# Altium footprint library Library.PcbLib: 308 footprints (part 16 of 21)
Each footprint in its own frame and in the unit in brackets; x right, y up, seen from the top. Pads: shape width x height; smd on the part's side, far side on the other; paste and mask are expansions set on the pad; w line width, h text height; cw(c..) or ccw(c..) is an arc to the next point about the centre after c.
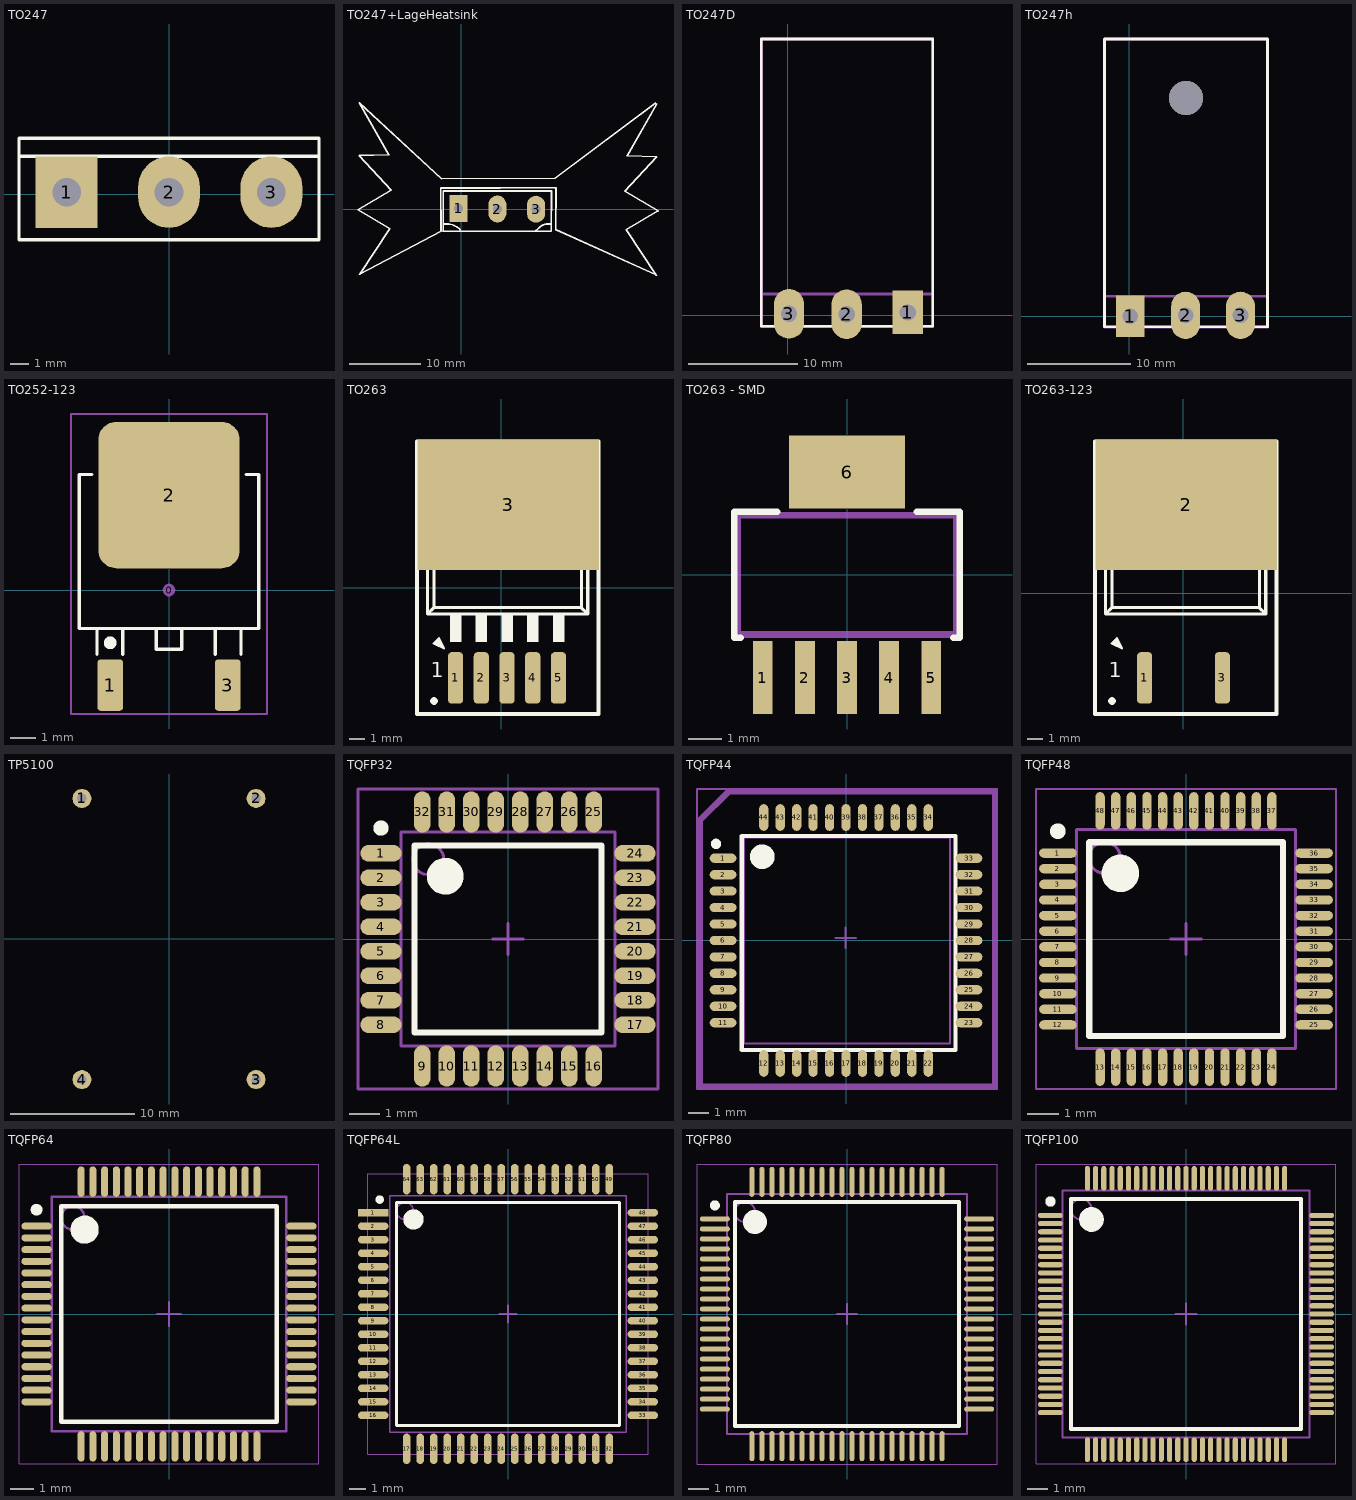
[diagram p15: the footprints below, top view; thin cyan lines are the x and y axes]

## TO247 [mil] "TO247"
height 200
pads (3):
  rect 130x150 hole 60: 1(-215,5)
  oval 130x150 hole 60: 2(0,5) 3(215,5)
Top Overlay:
  lines w7: -315,80 314,80 ; -315,-95 -315,118 315,118 315,-95 -315,-95
3D body "User Library-TO-247 CASE 340L-02 Vertical.STEP": height 1202.76, standoff -427.17, extent -314.96,-81.61 314.96,115.24

## TO247+LageHeatsink [mil]
pads (3):
  rect 100x150 hole 50: 1(-15,5)
  oval 100x150 hole 50: 2(200,1) 3(415,0)
Top Overlay:
  lines w10: -102,-121 -101,-120 -101,102 501,102 500,-122 -101,-122 -100,-121 ; -100,-82 -80.43,-82 cw(c-80.43,-184.43) -8,-112 ; 208,119 526,119 524,-113 1082,-364 ; 214,118 -115,118 -113,-122 -566,-361 -398,-108 -575,-3 -391,106 -568,298 -403,303 -568,592 -111,170 520,172 1078,590 ; 415,-119 ccw(c415,-116.59) 416.71,-118.29 434,-101 cw(c479.87,-146.87) 479.87,-82 499,-82 ; 1084,-367 916,-114 1093,-9 909,100 1086,292 921,297 1086,586
3D body "User Library-OHMITE_FA-T220-64E.step": height 2600, standoff -49.61, extent -613.9,-364.71 1023.89,624.71
3D body "User Library-TO-247 CASE 340L-02 Vertical.STEP": height 1187.01, standoff -442.91, extent -114.96,-85 514.96,111.85

## TO247D [mil]
pads (3):
  rect 110x157.48 hole 59.06: 1(435,10)
  oval 110x180 hole 59.06: 2(213.66,4) 3(5,5)
Top Overlay:
  lines w10: -95,-40 -95,1000 525,1000 525,-40 -95,-40
Mechanical 1:
  lines w10: -93.43,76.83 520.75,76.83 ; -93.43,-41.28 525,-41.28 525,1000 -93.43,1000 -93.43,-41.28
3D body "User Library-TO-247H.step": height 216.54, standoff -251.97, extent -85.11,-4.99 525.12,995.01

## TO247h [mil]
pads (3):
  rect 110x157.48 hole 59.06: 1(3,1)
  oval 110x180 hole 59.06: 2(213.66,4) 3(422.32,4)
via 215,830 diameter 129.92 hole 129.92
Top Overlay:
  lines w10: -95,-40 -95,1055 525,1055 525,-40 -95,-40
Mechanical 1:
  lines w10: -93.43,76.83 520.75,76.83 ; -93.43,-41.28 525,-41.28 525,1055 -93.43,1055 -93.43,-41.28
3D body "User Library-TO-247_bent_leads.step": height 212.6, standoff -259.84, extent -97.99,-15 527.99,1047.28

## TO252-123 [mm]
pads (4):
  round 0.5 on Mech15: 0(0,0)
  rrect25% 1x2 smd: 1(-2.285,-3.7) 3(2.285,-3.7)
  rrect25% 5.5x5.7 smd: 2(0,3.7)
Top Overlay:
  circle w0.25: c-2.289,-2.053 r0.125
  lines w0.127: -3,4.5 -3.5,4.5 -3.5,-1.5 3.5,-1.5 3.5,4.5 3,4.5 ; -2.8,-2.5 -2.8,-1.5 -1.8,-1.5 -1.8,-2.5 ; 1.8,-2.5 1.8,-1.5 2.8,-1.5 2.8,-2.5 ; -0.5,-2.3 -0.5,-1.5 0.5,-1.5 0.5,-2.3 -0.5,-2.3
Mechanical 15:
  lines w0.076: -3.81,-4.826 -3.81,6.858 3.81,6.858 3.81,-4.826 -3.81,-4.826
3D body "DPAK.stp": height 2.31, standoff 0, extent -3.3,-3.951 3.3,5.762

## TO263 [mm]
pads (6):
  rrect50% 1x3.4 smd: 1(-3.019,-5.969) 2(-1.319,-5.969) 4(2.081,-5.969) 5(3.781,-5.969)
  rrect50% 1x3.4 smd mask+0: 3(0.381,-5.969)
  rect 12x8.634 smd: 3(0.457,5.461)
Top Overlay:
  circle w0.25: c-4.443,-7.493 r0.125
  rectangle: -3.398,-3.607 -2.64,-1.728
  rectangle: -1.698,-3.607 -0.94,-1.728
  rectangle: 0.002,-3.607 0.76,-1.728
  rectangle: 1.702,-3.607 2.46,-1.728
  rectangle: 3.402,-3.607 4.16,-1.728
  lines w0.127: -4.293,-3.511 -4.104,-3.319 -3.774,-4.03 ; -4.293,-3.511 -4.485,-3.7 -3.774,-4.03 ; -4.293,-3.511 -3.774,-4.03
  lines w0.178: -4.307,-3.649 -4.129,-3.827 ; -4.155,-3.497 -3.977,-3.675
  lines w0.2: -4.873,-1.753 5.71,-1.753 ; -4.873,-1.753 -4.873,6.926 ; -4.873,-1.753 -4.45,-1.329 ; -4.873,6.926 5.71,6.926 ; -4.873,6.926 -4.873,7.747 -3.392,8.619 4.228,8.619 5.71,7.747 5.71,6.926 ; -4.873,6.926 -4.45,6.502 ; -4.45,-1.329 -4.45,6.502 ; -4.45,-1.329 5.287,-1.329 ; -4.45,6.502 5.287,6.502 ; 5.287,-1.329 5.287,6.502 ; 5.287,-1.329 5.71,-1.753 ; 5.287,6.502 5.71,6.926 ; 5.71,-1.753 5.71,6.926
  lines w0.254: -5.568,-8.35 -5.568,9.65 6.432,9.65 6.432,-8.35 -5.568,-8.35
  text "1" at -4.645,-5.918 h1
Top Solder:
  rectangle: -5.136,1.397 5.99,8.56
  lines w0.254: -3.482,8.935 -4.963,8.512 ; 4.319,8.935 5.8,8.512 ; 5.969,8.382 6.096,8.255 6.096,1.27 5.461,1.27 -5.197,1.27 -5.202,1.275 -5.202,6.926 -5.202,8.196 ; 6.039,6.926 6.039,8.196 ; -5.202,8.196 cw(c-4.873,8.196) -4.964,8.512 ; -5.202,8.196 cw(c-4.873,8.196) -4.964,8.512 ; -3.392,8.948 ccw(c-3.392,8.619) -3.482,8.935 cw(c-3.392,8.619) -3.392,8.948 ; -3.392,8.948 4.228,8.948 ; 4.228,8.948 cw(c4.228,8.619) 4.319,8.935 ccw(c4.228,8.619) 4.228,8.948 ; 5.801,8.512 cw(c5.71,8.196) 6.039,8.196 ; 5.801,8.512 cw(c5.71,8.196) 6.039,8.196
  lines w0.508: -4.196,8.577 5.05,8.577
3D body "SW3dPS-TO-263 5Ld.STEP": height 4.57, standoff -0.01, extent -4.729,-6.839 5.431,7.801

## TO263 - SMD [mm]
pads (6):
  rect 0.6x2.2 smd: 1(-2.54,-3.1) 2(-1.27,-3.1) 3(0,-3.1) 4(1.27,-3.1) 5(2.54,-3.1)
  rect 3.5x2.2 smd: 6(0,3.1)
Top Overlay:
  lines w0.2: -3.2,-1.9 -3.4,-1.9 -3.4,1.9 -2.1,1.9 ; 2.1,1.9 3.4,1.9 3.4,-1.9 3.2,-1.9
Mechanical 16:
  lines w0.2: -3.3,-1.8 -3.3,1.8 3.3,1.8 3.3,-1.8 -3.3,-1.8
3D body "TPS73701DCQ.step": height 1.8, standoff 0, extent -3.275,-3.63 3.275,3.63

## TO263-123 [mm]
pads (3):
  rrect50% 1x3.4 smd: 1(-2.54,-5.588) 3(2.591,-5.588)
  rect 12x8.634 smd: 2(0.203,5.842)
Top Overlay:
  circle w0.25: c-4.697,-7.112 r0.125
  lines w0.127: -4.547,-3.13 -4.358,-2.938 -4.028,-3.649 ; -4.547,-3.13 -4.739,-3.319 -4.028,-3.649 ; -4.547,-3.13 -4.028,-3.649
  lines w0.178: -4.561,-3.268 -4.383,-3.446 ; -4.409,-3.116 -4.231,-3.294
  lines w0.2: -5.127,-1.372 5.456,-1.372 ; -5.127,-1.372 -5.127,7.307 ; -5.127,-1.372 -4.704,-0.948 ; -5.127,7.307 5.456,7.307 ; -5.127,7.307 -5.127,8.128 -3.646,9 3.974,9 5.456,8.128 5.456,7.307 ; -5.127,7.307 -4.704,6.883 ; -4.704,-0.948 -4.704,6.883 ; -4.704,-0.948 5.033,-0.948 ; -4.704,6.883 5.033,6.883 ; 5.033,-0.948 5.033,6.883 ; 5.033,-0.948 5.456,-1.372 ; 5.033,6.883 5.456,7.307 ; 5.456,-1.372 5.456,7.307
  lines w0.254: -5.822,-7.969 -5.822,10.031 6.178,10.031 6.178,-7.969 -5.822,-7.969
  text "1" at -4.899,-5.537 h1
Top Solder:
  rectangle: -5.39,1.778 5.736,8.941
  lines w0.254: -3.736,9.316 -5.217,8.893 ; 4.065,9.316 5.546,8.893 ; 5.715,8.763 5.842,8.636 5.842,1.651 5.207,1.651 -5.451,1.651 -5.456,1.656 -5.456,7.307 -5.456,8.577 ; 5.785,7.307 5.785,8.577 ; -5.456,8.577 cw(c-5.127,8.577) -5.218,8.893 ; -5.456,8.577 cw(c-5.127,8.577) -5.218,8.893 ; -3.646,9.329 ccw(c-3.646,9) -3.736,9.316 cw(c-3.646,9) -3.646,9.329 ; -3.646,9.329 3.974,9.329 ; 3.974,9.329 cw(c3.974,9) 4.065,9.316 ccw(c3.974,9) 3.974,9.329 ; 5.547,8.893 cw(c5.456,8.577) 5.785,8.577 ; 5.547,8.893 cw(c5.456,8.577) 5.785,8.577
  lines w0.508: -4.45,8.958 4.796,8.958
3D body "User Library-TO263-3S.STEP": height 4.81, standoff 0.01, extent -4.967,-6.477 5.033,9.193

## TP5100 [mil] "2A Lion Charger"
pads (4):
  round 60 hole 30: 1(-275.59,444.88) 2(275.59,444.88) 3(275.59,-444.88) 4(-275.59,-444.88)
3D body "tp5100 v2 (step).step": height 194.49, standoff 15.75, extent -334.65,-492.13 334.65,492.13

## TQFP32 [mm] "Thin QFP, 32-Leads, Body 9x9mm, Pitch 0.8mm, IPC Low Density"
height 1.6
pads (32):
  oval 1.35x0.55 smd: 1(-4.15,2.8) 2(-4.15,2) 3(-4.15,1.2) 4(-4.15,0.4) 5(-4.15,-0.4) 6(-4.15,-1.2) 7(-4.15,-2) 8(-4.15,-2.8) 17(4.15,-2.8) 18(4.15,-2) 19(4.15,-1.2) 20(4.15,-0.4) 21(4.15,0.4) 22(4.15,1.2) 23(4.15,2) 24(4.15,2.8)
  oval 0.55x1.35 smd: 9(-2.8,-4.15) 10(-2,-4.15) 11(-1.2,-4.15) 12(-0.4,-4.15) 13(0.4,-4.15) 14(1.2,-4.15) 15(2,-4.15) 16(2.8,-4.15) 25(2.8,4.15) 26(2,4.15) 27(1.2,4.15) 28(0.4,4.15) 29(-0.4,4.15) 30(-1.2,4.15) 31(-2,4.15) 32(-2.8,4.15)
Top Overlay:
  circle w0.25: c-4.15,3.625 r0.125
  circle w0.6: c-2.05,2.05 r0.3
  lines w0.2: -3.05,-3.05 -3.05,3.05 3.05,3.05 3.05,-3.05 -3.05,-3.05
Mechanical 13:
  circle w0.1: c-2.6,2.6 r0.5
  lines w0.1: -3.5,-3.5 -3.5,3.5 3.5,3.5 3.5,-3.5 -3.5,-3.5
Mechanical 15:
  lines w0.1: -0.5,0 0.5,0 ; 0,-0.5 0,0.5 ; -4.9,-4.9 -4.9,4.9 4.9,4.9 4.9,-4.9 -4.9,-4.9
3D body "User Library-TQFP-32.STEP": height 1.4, standoff -0.06, extent -4.5,-4.5 4.5,4.5

## TQFP44 [mm] "TQFP, 44-Leads, Body 10X10mm, Pitch 0.80mm, IPC High Density"
height 1.2
pads (44):
  oval 1.3x0.45 smd: 1(-5.981,4) 2(-5.981,3.2) 3(-5.981,2.4) 4(-5.981,1.6) 5(-5.981,0.8) 6(-5.981,0) 7(-5.981,-0.8) 8(-5.981,-1.6) 9(-5.981,-2.4) 10(-5.981,-3.2) 11(-5.981,-4) 23(5.981,-4) 24(5.981,-3.2) 25(5.981,-2.4) 26(5.981,-1.6) 27(5.981,-0.8) 28(5.981,0) 29(5.981,0.8) 30(5.981,1.6) 31(5.981,2.4) 32(5.981,3.2) 33(5.981,4)
  oval 0.45x1.3 smd: 12(-4,-5.981) 13(-3.2,-5.981) 14(-2.4,-5.981) 15(-1.6,-5.981) 16(-0.8,-5.981) 17(0,-5.981) 18(0.8,-5.981) 19(1.6,-5.981) 20(2.4,-5.981) 21(3.2,-5.981) 22(4,-5.981) 34(4,5.981) 35(3.2,5.981) 36(2.4,5.981) 37(1.6,5.981) 38(0.8,5.981) 39(0,5.981) 40(-0.8,5.981) 41(-1.6,5.981) 42(-2.4,5.981) 43(-3.2,5.981) 44(-4,5.981)
Top Overlay:
  circle w0.25: c-6.323,4.698 r0.125
  circle w0.6: c-4.073,4.073 r0.3
  lines w0.2: -5.073,-5.327 -5.073,5.073 5.327,5.073 5.327,-5.327 -5.073,-5.327
Mechanical 13:
  circle w0.1: c-4.053,4.1 r0.5
  lines w0.1: -4.953,-5 -4.953,5 5.047,5 5.047,-5 -4.953,-5
Mechanical 15:
  lines w0.1: -0.516,0.127 0.484,0.127 ; -0.016,-0.373 -0.016,0.627 ; -7.239,-7.223 -7.239,7.366 7.334,7.366 7.334,-7.223 -7.239,-7.223
  lines w0.3: -7.112,-7.112 7.239,-7.112 7.239,7.239 -5.715,7.239 -7.112,5.842 -7.112,-7.112
  text ".Designator" at -4.4,0 h1
Mechanical 16:
  lines w0.3: -7.112,-7.112 7.239,-7.112 7.239,7.239 -5.715,7.239 -7.112,5.842 -7.112,-7.112
  text ".Comment" at -4.4,-2.4 h1
3D body "User Library-TQFP44.step": height 1.05, standoff -0.02, extent -5.994,-5.957 6.006,6.043

## TQFP48 [mm] "TQFP, 48-Leads, Body 7.00x7.00mm, Pitch 0.50mm, IPC High Density"
height 1.6
pads (48):
  oval 1.2x0.3 smd: 1(-4.1,2.75) 2(-4.1,2.25) 3(-4.1,1.75) 4(-4.1,1.25) 5(-4.1,0.75) 6(-4.1,0.25) 7(-4.1,-0.25) 8(-4.1,-0.75) 9(-4.1,-1.25) 10(-4.1,-1.75) 11(-4.1,-2.25) 12(-4.1,-2.75) 25(4.1,-2.75) 26(4.1,-2.25) 27(4.1,-1.75) 28(4.1,-1.25) 29(4.1,-0.75) 30(4.1,-0.25) 31(4.1,0.25) 32(4.1,0.75) 33(4.1,1.25) 34(4.1,1.75) 35(4.1,2.25) 36(4.1,2.75)
  oval 0.3x1.2 smd: 13(-2.75,-4.1) 14(-2.25,-4.1) 15(-1.75,-4.1) 16(-1.25,-4.1) 17(-0.75,-4.1) 18(-0.25,-4.1) 19(0.25,-4.1) 20(0.75,-4.1) 21(1.25,-4.1) 22(1.75,-4.1) 23(2.25,-4.1) 24(2.75,-4.1) 37(2.75,4.1) 38(2.25,4.1) 39(1.75,4.1) 40(1.25,4.1) 41(0.75,4.1) 42(0.25,4.1) 43(-0.25,4.1) 44(-0.75,4.1) 45(-1.25,4.1) 46(-1.75,4.1) 47(-2.25,4.1) 48(-2.75,4.1)
Top Overlay:
  circle w0.25: c-4.1,3.45 r0.125
  circle w0.6: c-2.1,2.1 r0.3
  lines w0.2: -3.1,-3.1 -3.1,3.1 3.1,3.1 3.1,-3.1 -3.1,-3.1
Mechanical 13:
  circle w0.1: c-2.6,2.6 r0.5
  lines w0.1: -3.5,-3.5 -3.5,3.5 3.5,3.5 3.5,-3.5 -3.5,-3.5
Mechanical 15:
  lines w0.05: -4.8,-4.8 -4.8,4.8 4.8,4.8 4.8,-4.8 -4.8,-4.8
  lines w0.1: -0.5,0 0.5,0 ; 0,-0.5 0,0.5
3D body "User Library-TQFP-48.STEP": height 1.45, standoff -0.01, extent -4.5,-4.5 4.5,4.5

## TQFP64 [mm] "TQFP, 64-Leads, Body 10.00x10.00mm, Pitch 0.50mm, IPC High Density"
height 1.3
pads (64):
  oval 1.3x0.3 smd: 1(-5.65,3.75) 2(-5.65,3.25) 3(-5.65,2.75) 4(-5.65,2.25) 5(-5.65,1.75) 6(-5.65,1.25) 7(-5.65,0.75) 8(-5.65,0.25) 9(-5.65,-0.25) 10(-5.65,-0.75) 11(-5.65,-1.25) 12(-5.65,-1.75) 13(-5.65,-2.25) 14(-5.65,-2.75) 15(-5.65,-3.25) 16(-5.65,-3.75) 33(5.65,-3.75) 34(5.65,-3.25) 35(5.65,-2.75) 36(5.65,-2.25) 37(5.65,-1.75) 38(5.65,-1.25) 39(5.65,-0.75) 40(5.65,-0.25) 41(5.65,0.25) 42(5.65,0.75) 43(5.65,1.25) 44(5.65,1.75) 45(5.65,2.25) 46(5.65,2.75) 47(5.65,3.25) 48(5.65,3.75)
  oval 0.3x1.3 smd: 17(-3.75,-5.65) 18(-3.25,-5.65) 19(-2.75,-5.65) 20(-2.25,-5.65) 21(-1.75,-5.65) 22(-1.25,-5.65) 23(-0.75,-5.65) 24(-0.25,-5.65) 25(0.25,-5.65) 26(0.75,-5.65) 27(1.25,-5.65) 28(1.75,-5.65) 29(2.25,-5.65) 30(2.75,-5.65) 31(3.25,-5.65) 32(3.75,-5.65) 49(3.75,5.65) 50(3.25,5.65) 51(2.75,5.65) 52(2.25,5.65) 53(1.75,5.65) 54(1.25,5.65) 55(0.75,5.65) 56(0.25,5.65) 57(-0.25,5.65) 58(-0.75,5.65) 59(-1.25,5.65) 60(-1.75,5.65) 61(-2.25,5.65) 62(-2.75,5.65) 63(-3.25,5.65) 64(-3.75,5.65)
Top Overlay:
  circle w0.6: c-3.6,3.6 r0.3
  circle w0.25: c-5.65,4.45 r0.125
  lines w0.2: -4.6,-4.6 4.6,-4.6 4.6,4.6 -4.6,4.6 -4.6,-4.6
Mechanical 13:
  circle w0.1: c-4.1,4.1 r0.5
  lines w0.1: -5,-5 5,-5 5,5 -5,5 -5,-5
Mechanical 15:
  lines w0.05: -6.4,-6.4 6.4,-6.4 6.4,6.4 -6.4,6.4 -6.4,-6.4
  lines w0.1: -0.5,0 0.5,0 ; 0,-0.5 0,0.5
3D body "User Library-S-PQFP-G64.step": height 1, standoff 0, extent -5.787,-5.79 5.787,5.791

## TQFP64L [mm] "TQFP, 64-Leads, Body 14.00x14.00mm, Pitch 0.80mm, IPC High Density"
height 1.4
pads (64):
  rect 1.8x0.45 smd: 1(-7.981,6)
  oval 1.8x0.45 smd: 2(-7.981,5.2) 3(-7.981,4.4) 4(-7.981,3.6) 5(-7.981,2.8) 6(-7.981,2) 7(-7.981,1.2) 8(-7.981,0.4) 9(-7.981,-0.4) 10(-7.981,-1.2) 11(-7.981,-2) 12(-7.981,-2.8) 13(-7.981,-3.6) 14(-7.981,-4.4) 15(-7.981,-5.2) 16(-7.981,-6) 33(7.981,-6) 34(7.981,-5.2) 35(7.981,-4.4) 36(7.981,-3.6) 37(7.981,-2.8) 38(7.981,-2) 39(7.981,-1.2) 40(7.981,-0.4) 41(7.981,0.4) 42(7.981,1.2) 43(7.981,2) 44(7.981,2.8) 45(7.981,3.6) 46(7.981,4.4) 47(7.981,5.2) 48(7.981,6)
  oval 0.45x1.8 smd: 17(-6,-7.981) 18(-5.2,-7.981) 19(-4.4,-7.981) 20(-3.6,-7.981) 21(-2.8,-7.981) 22(-2,-7.981) 23(-1.2,-7.981) 24(-0.4,-7.981) 25(0.4,-7.981) 26(1.2,-7.981) 27(2,-7.981) 28(2.8,-7.981) 29(3.6,-7.981) 30(4.4,-7.981) 31(5.2,-7.981) 32(6,-7.981) 49(6,7.981) 50(5.2,7.981) 51(4.4,7.981) 52(3.6,7.981) 53(2.8,7.981) 54(2,7.981) 55(1.2,7.981) 56(0.4,7.981) 57(-0.4,7.981) 58(-1.2,7.981) 59(-2,7.981) 60(-2.8,7.981) 61(-3.6,7.981) 62(-4.4,7.981) 63(-5.2,7.981) 64(-6,7.981)
Top Overlay:
  circle w0.6: c-5.6,5.6 r0.3
  circle w0.25: c-7.6,6.775 r0.125
  lines w0.2: -6.604,-6.604 6.596,-6.604 ; -6.6,-6.6 -6.6,6.6 6.6,6.6 6.6,-6.6
Mechanical 13:
  circle w0.1: c-6.1,6.1 r0.5
  lines w0.1: -7,-7 7,-7 7,7 -7,7 -7,-7
Mechanical 15:
  lines w0.05: -8.3,-8.3 8.3,-8.3 8.3,8.3 -8.3,8.3 -8.3,-8.3
  lines w0.1: -0.5,0 0.5,0 ; 0,-0.5 0,0.5
3D body "User Library-atmega64 (tqfp64).step": height 1.1, standoff -0.01, extent -7.968,-7.968 8.032,8.032

## TQFP80 [mm] "TQFP, 80-Leads, Body 12.00x12.00mm, Pitch 0.50mm, IPC High Density"
height 1
pads (80):
  oval 1.5x0.25 smd: 1(-6.6,4.75) 2(-6.6,4.25) 3(-6.6,3.75) 4(-6.6,3.25) 5(-6.6,2.75) 6(-6.6,2.25) 7(-6.6,1.75) 8(-6.6,1.25) 9(-6.6,0.75) 10(-6.6,0.25) 11(-6.6,-0.25) 12(-6.6,-0.75) 13(-6.6,-1.25) 14(-6.6,-1.75) 15(-6.6,-2.25) 16(-6.6,-2.75) 17(-6.6,-3.25) 18(-6.6,-3.75) 19(-6.6,-4.25) 20(-6.6,-4.75) 41(6.6,-4.75) 42(6.6,-4.25) 43(6.6,-3.75) 44(6.6,-3.25) 45(6.6,-2.75) 46(6.6,-2.25) 47(6.6,-1.75) 48(6.6,-1.25) 49(6.6,-0.75) 50(6.6,-0.25) 51(6.6,0.25) 52(6.6,0.75) 53(6.6,1.25) 54(6.6,1.75) 55(6.6,2.25) 56(6.6,2.75) 57(6.6,3.25) 58(6.6,3.75) 59(6.6,4.25) 60(6.6,4.75)
  oval 0.25x1.5 smd: 21(-4.75,-6.6) 22(-4.25,-6.6) 23(-3.75,-6.6) 24(-3.25,-6.6) 25(-2.75,-6.6) 26(-2.25,-6.6) 27(-1.75,-6.6) 28(-1.25,-6.6) 29(-0.75,-6.6) 30(-0.25,-6.6) 31(0.25,-6.6) 32(0.75,-6.6) 33(1.25,-6.6) 34(1.75,-6.6) 35(2.25,-6.6) 36(2.75,-6.6) 37(3.25,-6.6) 38(3.75,-6.6) 39(4.25,-6.6) 40(4.75,-6.6) 61(4.75,6.6) 62(4.25,6.6) 63(3.75,6.6) 64(3.25,6.6) 65(2.75,6.6) 66(2.25,6.6) 67(1.75,6.6) 68(1.25,6.6) 69(0.75,6.6) 70(0.25,6.6) 71(-0.25,6.6) 72(-0.75,6.6) 73(-1.25,6.6) 74(-1.75,6.6) 75(-2.25,6.6) 76(-2.75,6.6) 77(-3.25,6.6) 78(-3.75,6.6) 79(-4.25,6.6) 80(-4.75,6.6)
Top Overlay:
  circle w0.25: c-6.6,5.425 r0.125
  circle w0.6: c-4.6,4.6 r0.3
  lines w0.2: -5.6,-5.6 -5.6,5.6 5.6,5.6 5.6,-5.6 -5.6,-5.6
Mechanical 13:
  circle w0.1: c-5.1,5.1 r0.5
  lines w0.1: -6,-6 -6,6 6,6 6,-6 -6,-6
Mechanical 15:
  lines w0.05: -7.493,-7.493 -7.493,7.493 7.493,7.493 7.493,-7.493 -7.493,-7.493
  lines w0.1: -0.5,0 0.5,0 ; 0,-0.5 0,0.5
3D body "User Library-TQFP-80.STEP": height 1.05, standoff -0.01, extent -7,-7 7,7

## TQFP100 [mm] "TQFP, 100-Leads, Body 12.00x12.00mm, Pitch 0.40mm, IPC High Density"
height 1
pads (100):
  oval 1.2x0.25 smd: 1(-6.6,4.8) 2(-6.6,4.4) 3(-6.6,4) 4(-6.6,3.6) 5(-6.6,3.2) 6(-6.6,2.8) 7(-6.6,2.4) 8(-6.6,2) 9(-6.6,1.6) 10(-6.6,1.2) 11(-6.6,0.8) 12(-6.6,0.4) 13(-6.6,0) 14(-6.6,-0.4) 15(-6.6,-0.8) 16(-6.6,-1.2) 17(-6.6,-1.6) 18(-6.6,-2) 19(-6.6,-2.4) 20(-6.6,-2.8) 21(-6.6,-3.2) 22(-6.6,-3.6) 23(-6.6,-4) 24(-6.6,-4.4) 25(-6.6,-4.8) 51(6.6,-4.8) 52(6.6,-4.4) 53(6.6,-4) 54(6.6,-3.6) 55(6.6,-3.2) 56(6.6,-2.8) 57(6.6,-2.4) 58(6.6,-2) 59(6.6,-1.6) 60(6.6,-1.2) 61(6.6,-0.8) 62(6.6,-0.4) 63(6.6,0) 64(6.6,0.4) 65(6.6,0.8) 66(6.6,1.2) 67(6.6,1.6) 68(6.6,2) 69(6.6,2.4) 70(6.6,2.8) 71(6.6,3.2) 72(6.6,3.6) 73(6.6,4) 74(6.6,4.4) 75(6.6,4.8)
  oval 0.25x1.2 smd: 26(-4.8,-6.6) 27(-4.4,-6.6) 28(-4,-6.6) 29(-3.6,-6.6) 30(-3.2,-6.6) 31(-2.8,-6.6) 32(-2.4,-6.6) 33(-2,-6.6) 34(-1.6,-6.6) 35(-1.2,-6.6) 36(-0.8,-6.6) 37(-0.4,-6.6) 38(0,-6.6) 39(0.4,-6.6) 40(0.8,-6.6) 41(1.2,-6.6) 42(1.6,-6.6) 43(2,-6.6) 44(2.4,-6.6) 45(2.8,-6.6) 46(3.2,-6.6) 47(3.6,-6.6) 48(4,-6.6) 49(4.4,-6.6) 50(4.8,-6.6) 76(4.8,6.6) 77(4.4,6.6) 78(4,6.6) 79(3.6,6.6) 80(3.2,6.6) 81(2.8,6.6) 82(2.4,6.6) 83(2,6.6) 84(1.6,6.6) 85(1.2,6.6) 86(0.8,6.6) 87(0.4,6.6) 88(0,6.6) 89(-0.4,6.6) 90(-0.8,6.6) 91(-1.2,6.6) 92(-1.6,6.6) 93(-2,6.6) 94(-2.4,6.6) 95(-2.8,6.6) 96(-3.2,6.6) 97(-3.6,6.6) 98(-4,6.6) 99(-4.4,6.6) 100(-4.8,6.6)
Top Overlay:
  circle w0.25: c-6.6,5.475 r0.125
  circle w0.6: c-4.6,4.6 r0.3
  lines w0.2: -5.6,-5.6 -5.6,5.6 5.6,5.6 5.6,-5.6 -5.6,-5.6
Mechanical 13:
  circle w0.1: c-5.1,5.1 r0.5
  lines w0.1: -6,-6 -6,6 6,6 6,-6 -6,-6
Mechanical 15:
  lines w0.05: -7.3,-7.3 -7.3,7.3 7.3,7.3 7.3,-7.3 -7.3,-7.3
  lines w0.1: -0.5,0 0.5,0 ; 0,-0.5 0,0.5
3D body "User Library-TQFP100_0_4mm.step": height 1.2, standoff 0, extent -7,-6.985 7,7.015